# Altium footprint library pw.PcbLib: 210 footprints (part 14 of 14)
Each footprint in its own frame and in the unit in brackets; x right, y up, seen from the top. Pads: shape width x height; smd on the part's side, far side on the other; paste and mask are expansions set on the pad; w line width, h text height; cw(c..) or ccw(c..) is an arc to the next point about the centre after c.
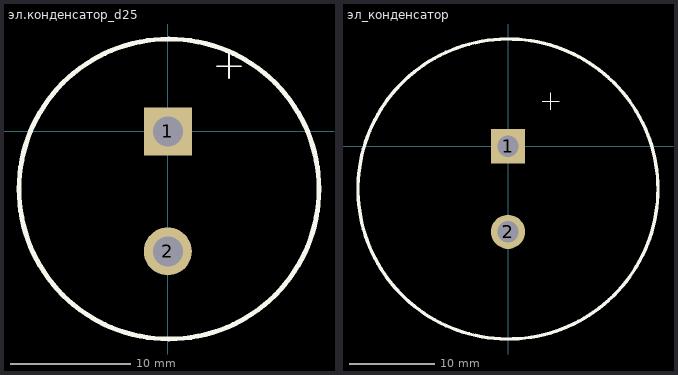
[diagram p13: the footprints below, top view; thin cyan lines are the x and y axes]

## эл.конденсатор_d25 [mm]
pads (2):
  rect 4x4 hole 2.5: 1(0,0)
  round 4 hole 2.5: 2(0,-10)
Top Overlay:
  circle w0.4: c0.1,-4.8 r12.5
  lines w0.125: 4.1,5.45 6.1,5.45 ; 5.1,4.45 5.1,6.45
3D body "User Library-Cap 25x50.STEP": height 50, standoff -19, extent -12.4,-17.3 12.6,7.7

## эл_конденсатор [mm]
pads (2):
  rect 4x4 hole 2.5: 1(0,0)
  round 4 hole 2.5: 2(0,-10)
Top Overlay:
  circle w0.4: c0,-5 r17.5
  lines w0.125: 4,5.25 6,5.25 ; 5,4.25 5,6.25
3D body "User Library-Assy_CE_R400_D1200_H2000.STEP": height 50.8, standoff -6.89, extent -15.74,-20.24 14.74,10.24